# Altium schematic symbol library MCU_ST_STM32F4.SchLib: 300 symbols (part 1 of 10) (continued)
## STM32F401VDHx (continued)
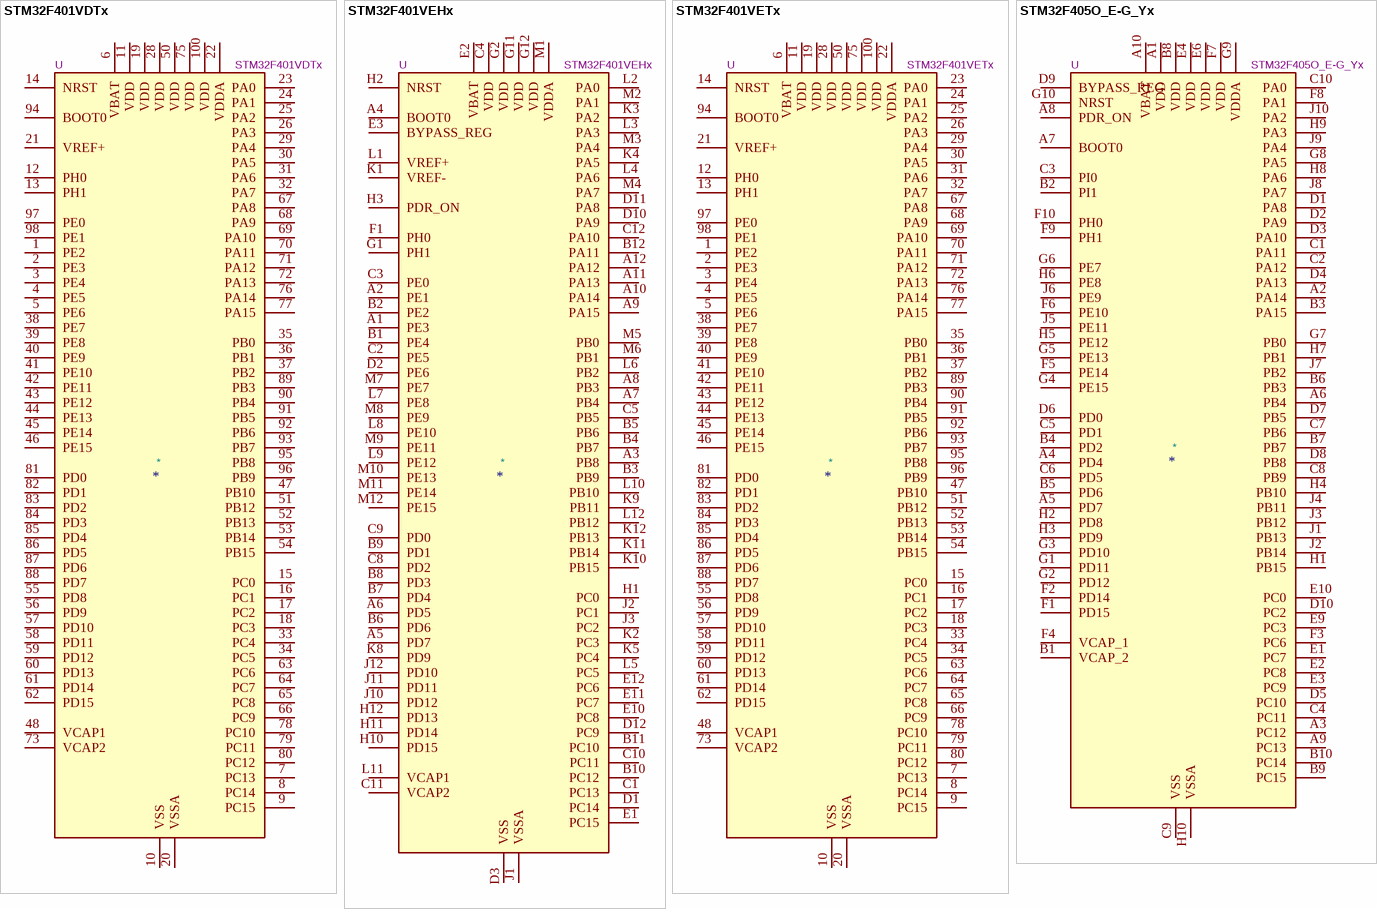
[diagram p4: symbols STM32F401VDTx to STM32F405O_E-G_Yx]

## STM32F401VDTx
designator *  value STM32F401VDTx  Reference: U
ki_keywords: Arm Cortex-M4 STM32F4 STM32F401; ki_description: STMicroelectronics Arm Cortex-M4 MCU, 384KB flash, 96KB RAM, 84 MHz, 1.7-3.6V, 81 GPIO, LQFP100; ki_fp_filters: LQFP*14x14mm*P0.5mm*; Footprint: Package_QFP:LQFP-100_14x14mm_P0.5mm; Datasheet: https://www.st.com/resource/en/datasheet/stm32f401vd.pdf
pins: 1 PE2, 2 PE3, 3 PE4, 4 PE5, 5 PE6, 6 VBAT, 7 PC13, 8 PC14, 9 PC15, 10 VSS, 11 VDD, 12 PH0, 13 PH1, 14 NRST, 15 PC0, 16 PC1, 17 PC2, 18 PC3, 19 VDD, 20 VSSA, 21 VREF+, 22 VDDA, 23 PA0, 24 PA1, 25 PA2, 26 PA3, 27 VSS hidden, 28 VDD, 29 PA4, 30 PA5, 31 PA6, 32 PA7, 33 PC4, 34 PC5, 35 PB0, 36 PB1, 37 PB2, 38 PE7, 39 PE8, 40 PE9, 41 PE10, 42 PE11, 43 PE12, 44 PE13, 45 PE14, 46 PE15, 47 PB10, 48 VCAP1, 49 VSS hidden, 50 VDD, 51 PB12, 52 PB13, 53 PB14, 54 PB15, 55 PD8, 56 PD9, 57 PD10, 58 PD11, 59 PD12, 60 PD13, 61 PD14, 62 PD15, 63 PC6, 64 PC7, 65 PC8, 66 PC9, 67 PA8, 68 PA9, 69 PA10, 70 PA11, 71 PA12, 72 PA13, 73 VCAP2, 74 VSS hidden, 75 VDD, 76 PA14, 77 PA15, 78 PC10, 79 PC11, 80 PC12, 81 PD0, 82 PD1, 83 PD2, 84 PD3, 85 PD4, 86 PD5, 87 PD6, 88 PD7, 89 PB3, 90 PB4, 91 PB5, 92 PB6, 93 PB7, 94 BOOT0, 95 PB8, 96 PB9, 97 PE0, 98 PE1, 99 VSS hidden, 100 VDD

## STM32F401VEHx
designator *  value STM32F401VEHx  Reference: U
ki_keywords: Arm Cortex-M4 STM32F4 STM32F401; ki_description: STMicroelectronics Arm Cortex-M4 MCU, 512KB flash, 96KB RAM, 84 MHz, 1.7-3.6V, 81 GPIO, UFBGA100; ki_fp_filters: *UFBGA*7x7mm*Layout12x12*P0.5mm*; Footprint: Package_BGA:UFBGA-100_7x7mm_Layout12x12_P0.5mm; Datasheet: https://www.st.com/resource/en/datasheet/stm32f401ve.pdf
pins: A1 PE3, A2 PE1, A3 PB8, A4 BOOT0, A5 PD7, A6 PD5, A7 PB4, A8 PB3, A9 PA15, A10 PA14, A11 PA13, A12 PA12, B1 PE4, B2 PE2, B3 PB9, B4 PB7, B5 PB6, B6 PD6, B7 PD4, B8 PD3, B9 PD1, B10 PC12, B11 PC10, B12 PA11, C1 PC13, C2 PE5, C3 PE0, C4 VDD, C5 PB5, C8 PD2, C9 PD0, C10 PC11, C11 VCAP2, C12 PA10, D1 PC14, D2 PE6, D3 VSS, D10 PA9, D11 PA8, D12 PC9, E1 PC15, E2 VBAT, E3 BYPASS_REG, E10 PC8, E11 PC7, E12 PC6, F1 PH0, F2 VSS hidden, F11 VSS hidden, F12 VSS hidden, G1 PH1, G2 VDD, G11 VDD, G12 VDD, H1 PC0, H2 NRST, H3 PDR_ON, H10 PD15, H11 PD14, H12 PD13, J1 VSSA, J2 PC1, J3 PC2, J10 PD12, J11 PD11, J12 PD10, K1 VREF-, K2 PC3, K3 PA2, K4 PA5, K5 PC4, K8 PD9, K9 PB11, K10 PB15, K11 PB14, K12 PB13, L1 VREF+, L2 PA0, L3 PA3, L4 PA6, L5 PC5, L6 PB2, L7 PE8, L8 PE10, L9 PE12, L10 PB10, L11 VCAP1, L12 PB12, M1 VDDA, M2 PA1, M3 PA4, M4 PA7, M5 PB0, M6 PB1, M7 PE7, M8 PE9, M9 PE11, M10 PE13, M11 PE14, M12 PE15

## STM32F401VETx
designator *  value STM32F401VETx  Reference: U
ki_keywords: Arm Cortex-M4 STM32F4 STM32F401; ki_description: STMicroelectronics Arm Cortex-M4 MCU, 512KB flash, 96KB RAM, 84 MHz, 1.7-3.6V, 81 GPIO, LQFP100; ki_fp_filters: LQFP*14x14mm*P0.5mm*; Footprint: Package_QFP:LQFP-100_14x14mm_P0.5mm; Datasheet: https://www.st.com/resource/en/datasheet/stm32f401ve.pdf
pins: 1 PE2, 2 PE3, 3 PE4, 4 PE5, 5 PE6, 6 VBAT, 7 PC13, 8 PC14, 9 PC15, 10 VSS, 11 VDD, 12 PH0, 13 PH1, 14 NRST, 15 PC0, 16 PC1, 17 PC2, 18 PC3, 19 VDD, 20 VSSA, 21 VREF+, 22 VDDA, 23 PA0, 24 PA1, 25 PA2, 26 PA3, 27 VSS hidden, 28 VDD, 29 PA4, 30 PA5, 31 PA6, 32 PA7, 33 PC4, 34 PC5, 35 PB0, 36 PB1, 37 PB2, 38 PE7, 39 PE8, 40 PE9, 41 PE10, 42 PE11, 43 PE12, 44 PE13, 45 PE14, 46 PE15, 47 PB10, 48 VCAP1, 49 VSS hidden, 50 VDD, 51 PB12, 52 PB13, 53 PB14, 54 PB15, 55 PD8, 56 PD9, 57 PD10, 58 PD11, 59 PD12, 60 PD13, 61 PD14, 62 PD15, 63 PC6, 64 PC7, 65 PC8, 66 PC9, 67 PA8, 68 PA9, 69 PA10, 70 PA11, 71 PA12, 72 PA13, 73 VCAP2, 74 VSS hidden, 75 VDD, 76 PA14, 77 PA15, 78 PC10, 79 PC11, 80 PC12, 81 PD0, 82 PD1, 83 PD2, 84 PD3, 85 PD4, 86 PD5, 87 PD6, 88 PD7, 89 PB3, 90 PB4, 91 PB5, 92 PB6, 93 PB7, 94 BOOT0, 95 PB8, 96 PB9, 97 PE0, 98 PE1, 99 VSS hidden, 100 VDD

## STM32F405O_E-G_Yx
designator *  value STM32F405O_E-G_Yx  Reference: U
ki_keywords: Arm Cortex-M4 STM32F4 STM32F405/415; ki_description: STMicroelectronics Arm Cortex-M4 MCU, 512-1024KB flash, 192KB RAM, 168 MHz, 1.8-3.6V, 72 GPIO, WLCSP90; ki_fp_filters: ST*WLCSP*Die413*; Footprint: Package_CSP:ST_WLCSP-90_Die413; Datasheet: https://www.st.com/resource/en/datasheet/stm32f405oe.pdf
pins: A1 VDD, A2 PA14, A3 PC12, A4 PD4, A5 PD7, A6 PB4, A7 BOOT0, A8 PDR_ON, A9 PC13, A10 VBAT, B1 VCAP_2, B2 PI1, B3 PA15, B4 PD2, B5 PD6, B6 PB3, B7 PB7, B8 VDD, B9 PC15, B10 PC14, C1 PA11, C2 PA12, C3 PI0, C4 PC11, C5 PD1, C6 PD5, C7 PB6, C8 PB9, C9 VSS, C10 PA0, D1 PA8, D2 PA9, D3 PA10, D4 PA13, D5 PC10, D6 PD0, D7 PB5, D8 PB8, D9 BYPASS_REG, D10 PC2, E1 PC7, E2 PC8, E3 PC9, E4 VDD, E5 VSS hidden, E6 VDD, E7 VSS hidden, E8 VSS hidden, E9 PC3, E10 PC0, F1 PD15, F2 PD14, F3 PC6, F4 VCAP_1, F5 PE14, F6 PE10, F7 VDD, F8 PA1, F9 PH1, F10 PH0, G1 PD11, G2 PD12, G3 PD10, G4 PE15, G5 PE13, G6 PE7, G7 PB0, G8 PA5, G9 VDDA, G10 NRST, H1 PB15, H2 PD8, H3 PD9, H4 PB10, H5 PE12, H6 PE8, H7 PB1, H8 PA6, H9 PA3, H10 VSSA, J1 PB13, J2 PB14, J3 PB12, J4 PB11, J5 PE11, J6 PE9, J7 PB2, J8 PA7, J9 PA4, J10 PA2

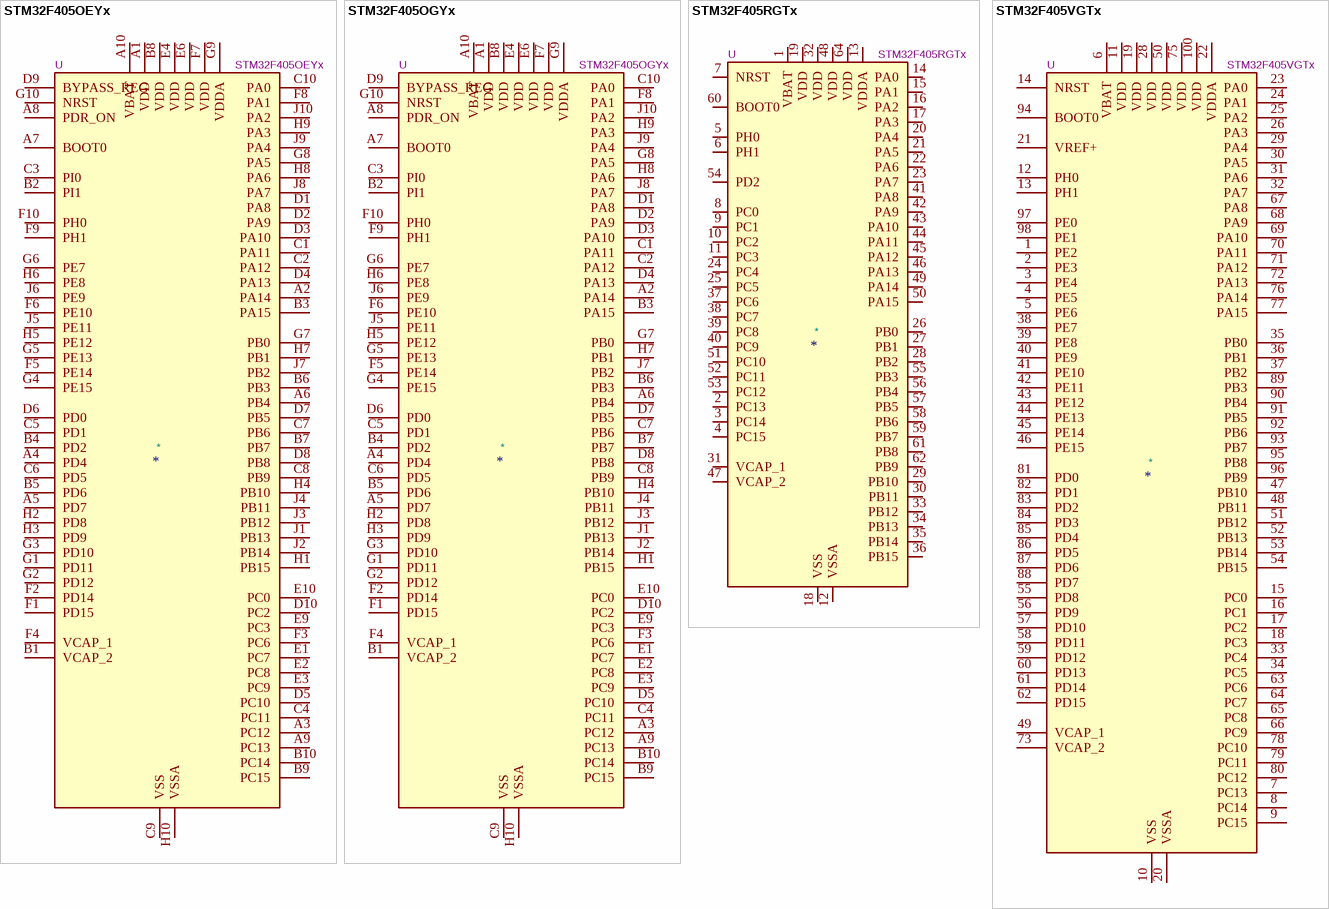
[diagram p5: symbols STM32F405OEYx to STM32F405VGTx]

## STM32F405OEYx
designator *  value STM32F405OEYx  Reference: U
ki_keywords: Arm Cortex-M4 STM32F4 STM32F405/415; ki_description: STMicroelectronics Arm Cortex-M4 MCU, 512KB flash, 192KB RAM, 168 MHz, 1.8-3.6V, 72 GPIO, WLCSP90; ki_fp_filters: ST*WLCSP*Die413*; Footprint: Package_CSP:ST_WLCSP-90_Die413; Datasheet: https://www.st.com/resource/en/datasheet/stm32f405oe.pdf
pins: A1 VDD, A2 PA14, A3 PC12, A4 PD4, A5 PD7, A6 PB4, A7 BOOT0, A8 PDR_ON, A9 PC13, A10 VBAT, B1 VCAP_2, B2 PI1, B3 PA15, B4 PD2, B5 PD6, B6 PB3, B7 PB7, B8 VDD, B9 PC15, B10 PC14, C1 PA11, C2 PA12, C3 PI0, C4 PC11, C5 PD1, C6 PD5, C7 PB6, C8 PB9, C9 VSS, C10 PA0, D1 PA8, D2 PA9, D3 PA10, D4 PA13, D5 PC10, D6 PD0, D7 PB5, D8 PB8, D9 BYPASS_REG, D10 PC2, E1 PC7, E2 PC8, E3 PC9, E4 VDD, E5 VSS hidden, E6 VDD, E7 VSS hidden, E8 VSS hidden, E9 PC3, E10 PC0, F1 PD15, F2 PD14, F3 PC6, F4 VCAP_1, F5 PE14, F6 PE10, F7 VDD, F8 PA1, F9 PH1, F10 PH0, G1 PD11, G2 PD12, G3 PD10, G4 PE15, G5 PE13, G6 PE7, G7 PB0, G8 PA5, G9 VDDA, G10 NRST, H1 PB15, H2 PD8, H3 PD9, H4 PB10, H5 PE12, H6 PE8, H7 PB1, H8 PA6, H9 PA3, H10 VSSA, J1 PB13, J2 PB14, J3 PB12, J4 PB11, J5 PE11, J6 PE9, J7 PB2, J8 PA7, J9 PA4, J10 PA2

## STM32F405OGYx
designator *  value STM32F405OGYx  Reference: U
ki_keywords: Arm Cortex-M4 STM32F4 STM32F405/415; ki_description: STMicroelectronics Arm Cortex-M4 MCU, 1024KB flash, 192KB RAM, 168 MHz, 1.8-3.6V, 72 GPIO, WLCSP90; ki_fp_filters: ST*WLCSP*Die413*; Footprint: Package_CSP:ST_WLCSP-90_Die413; Datasheet: https://www.st.com/resource/en/datasheet/stm32f405og.pdf
pins: A1 VDD, A2 PA14, A3 PC12, A4 PD4, A5 PD7, A6 PB4, A7 BOOT0, A8 PDR_ON, A9 PC13, A10 VBAT, B1 VCAP_2, B2 PI1, B3 PA15, B4 PD2, B5 PD6, B6 PB3, B7 PB7, B8 VDD, B9 PC15, B10 PC14, C1 PA11, C2 PA12, C3 PI0, C4 PC11, C5 PD1, C6 PD5, C7 PB6, C8 PB9, C9 VSS, C10 PA0, D1 PA8, D2 PA9, D3 PA10, D4 PA13, D5 PC10, D6 PD0, D7 PB5, D8 PB8, D9 BYPASS_REG, D10 PC2, E1 PC7, E2 PC8, E3 PC9, E4 VDD, E5 VSS hidden, E6 VDD, E7 VSS hidden, E8 VSS hidden, E9 PC3, E10 PC0, F1 PD15, F2 PD14, F3 PC6, F4 VCAP_1, F5 PE14, F6 PE10, F7 VDD, F8 PA1, F9 PH1, F10 PH0, G1 PD11, G2 PD12, G3 PD10, G4 PE15, G5 PE13, G6 PE7, G7 PB0, G8 PA5, G9 VDDA, G10 NRST, H1 PB15, H2 PD8, H3 PD9, H4 PB10, H5 PE12, H6 PE8, H7 PB1, H8 PA6, H9 PA3, H10 VSSA, J1 PB13, J2 PB14, J3 PB12, J4 PB11, J5 PE11, J6 PE9, J7 PB2, J8 PA7, J9 PA4, J10 PA2

## STM32F405RGTx
designator *  value STM32F405RGTx  Reference: U
ki_keywords: Arm Cortex-M4 STM32F4 STM32F405/415; ki_description: STMicroelectronics Arm Cortex-M4 MCU, 1024KB flash, 192KB RAM, 168 MHz, 1.8-3.6V, 51 GPIO, LQFP64; ki_fp_filters: LQFP*10x10mm*P0.5mm*; Footprint: Package_QFP:LQFP-64_10x10mm_P0.5mm; Datasheet: https://www.st.com/resource/en/datasheet/stm32f405rg.pdf
pins: 1 VBAT, 2 PC13, 3 PC14, 4 PC15, 5 PH0, 6 PH1, 7 NRST, 8 PC0, 9 PC1, 10 PC2, 11 PC3, 12 VSSA, 13 VDDA, 14 PA0, 15 PA1, 16 PA2, 17 PA3, 18 VSS, 19 VDD, 20 PA4, 21 PA5, 22 PA6, 23 PA7, 24 PC4, 25 PC5, 26 PB0, 27 PB1, 28 PB2, 29 PB10, 30 PB11, 31 VCAP_1, 32 VDD, 33 PB12, 34 PB13, 35 PB14, 36 PB15, 37 PC6, 38 PC7, 39 PC8, 40 PC9, 41 PA8, 42 PA9, 43 PA10, 44 PA11, 45 PA12, 46 PA13, 47 VCAP_2, 48 VDD, 49 PA14, 50 PA15, 51 PC10, 52 PC11, 53 PC12, 54 PD2, 55 PB3, 56 PB4, 57 PB5, 58 PB6, 59 PB7, 60 BOOT0, 61 PB8, 62 PB9, 63 VSS hidden, 64 VDD

## STM32F405VGTx
designator *  value STM32F405VGTx  Reference: U
ki_keywords: Arm Cortex-M4 STM32F4 STM32F405/415; ki_description: STMicroelectronics Arm Cortex-M4 MCU, 1024KB flash, 192KB RAM, 168 MHz, 1.8-3.6V, 82 GPIO, LQFP100; ki_fp_filters: LQFP*14x14mm*P0.5mm*; Footprint: Package_QFP:LQFP-100_14x14mm_P0.5mm; Datasheet: https://www.st.com/resource/en/datasheet/stm32f405vg.pdf
pins: 1 PE2, 2 PE3, 3 PE4, 4 PE5, 5 PE6, 6 VBAT, 7 PC13, 8 PC14, 9 PC15, 10 VSS, 11 VDD, 12 PH0, 13 PH1, 14 NRST, 15 PC0, 16 PC1, 17 PC2, 18 PC3, 19 VDD, 20 VSSA, 21 VREF+, 22 VDDA, 23 PA0, 24 PA1, 25 PA2, 26 PA3, 27 VSS hidden, 28 VDD, 29 PA4, 30 PA5, 31 PA6, 32 PA7, 33 PC4, 34 PC5, 35 PB0, 36 PB1, 37 PB2, 38 PE7, 39 PE8, 40 PE9, 41 PE10, 42 PE11, 43 PE12, 44 PE13, 45 PE14, 46 PE15, 47 PB10, 48 PB11, 49 VCAP_1, 50 VDD, 51 PB12, 52 PB13, 53 PB14, 54 PB15, 55 PD8, 56 PD9, 57 PD10, 58 PD11, 59 PD12, 60 PD13, 61 PD14, 62 PD15, 63 PC6, 64 PC7, 65 PC8, 66 PC9, 67 PA8, 68 PA9, 69 PA10, 70 PA11, 71 PA12, 72 PA13, 73 VCAP_2, 74 VSS hidden, 75 VDD, 76 PA14, 77 PA15, 78 PC10, 79 PC11, 80 PC12, 81 PD0, 82 PD1, 83 PD2, 84 PD3, 85 PD4, 86 PD5, 87 PD6, 88 PD7, 89 PB3, 90 PB4, 91 PB5, 92 PB6, 93 PB7, 94 BOOT0, 95 PB8, 96 PB9, 97 PE0, 98 PE1, 99 VSS hidden, 100 VDD

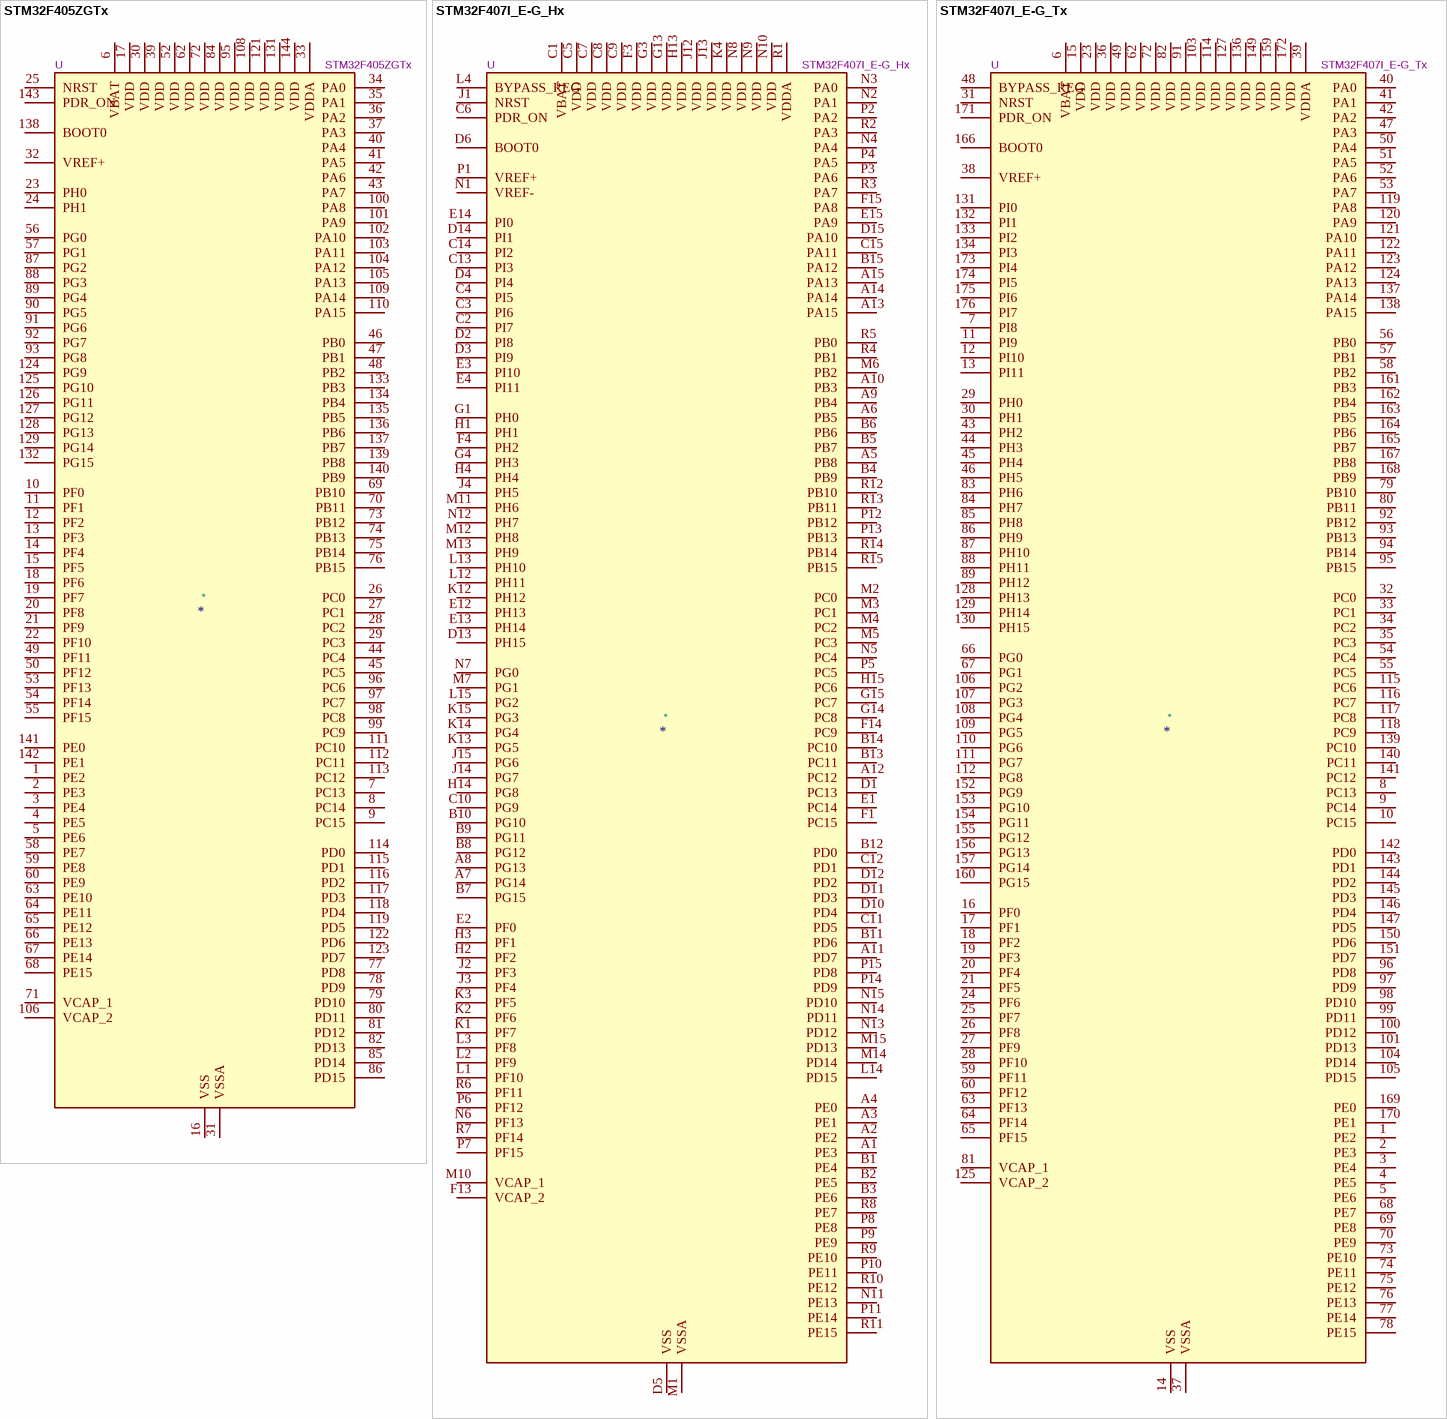
[diagram p6: symbols STM32F405ZGTx to STM32F407I_E-G_Tx]

## STM32F405ZGTx
designator *  value STM32F405ZGTx  Reference: U
ki_keywords: Arm Cortex-M4 STM32F4 STM32F405/415; ki_description: STMicroelectronics Arm Cortex-M4 MCU, 1024KB flash, 192KB RAM, 168 MHz, 1.8-3.6V, 114 GPIO, LQFP144; ki_fp_filters: LQFP*20x20mm*P0.5mm*; Footprint: Package_QFP:LQFP-144_20x20mm_P0.5mm; Datasheet: https://www.st.com/resource/en/datasheet/stm32f405zg.pdf
pins: 1 PE2, 2 PE3, 3 PE4, 4 PE5, 5 PE6, 6 VBAT, 7 PC13, 8 PC14, 9 PC15, 10 PF0, 11 PF1, 12 PF2, 13 PF3, 14 PF4, 15 PF5, 16 VSS, 17 VDD, 18 PF6, 19 PF7, 20 PF8, 21 PF9, 22 PF10, 23 PH0, 24 PH1, 25 NRST, 26 PC0, 27 PC1, 28 PC2, 29 PC3, 30 VDD, 31 VSSA, 32 VREF+, 33 VDDA, 34 PA0, 35 PA1, 36 PA2, 37 PA3, 38 VSS hidden, 39 VDD, 40 PA4, 41 PA5, 42 PA6, 43 PA7, 44 PC4, 45 PC5, 46 PB0, 47 PB1, 48 PB2, 49 PF11, 50 PF12, 51 VSS hidden, 52 VDD, 53 PF13, 54 PF14, 55 PF15, 56 PG0, 57 PG1, 58 PE7, 59 PE8, 60 PE9, 61 VSS hidden, 62 VDD, 63 PE10, 64 PE11, 65 PE12, 66 PE13, 67 PE14, 68 PE15, 69 PB10, 70 PB11, 71 VCAP_1, 72 VDD, 73 PB12, 74 PB13, 75 PB14, 76 PB15, 77 PD8, 78 PD9, 79 PD10, 80 PD11, 81 PD12, 82 PD13, 83 VSS hidden, 84 VDD, 85 PD14, 86 PD15, 87 PG2, 88 PG3, 89 PG4, 90 PG5, 91 PG6, 92 PG7, 93 PG8, 94 VSS hidden, 95 VDD, 96 PC6, 97 PC7, 98 PC8, 99 PC9, 100 PA8, 101 PA9, 102 PA10, 103 PA11, 104 PA12, 105 PA13, 106 VCAP_2, 107 VSS hidden, 108 VDD, 109 PA14, 110 PA15, 111 PC10, 112 PC11, 113 PC12, 114 PD0, 115 PD1, 116 PD2, 117 PD3, 118 PD4, 119 PD5, 120 VSS hidden, 121 VDD, 122 PD6, 123 PD7, 124 PG9, 125 PG10, 126 PG11, 127 PG12, 128 PG13, 129 PG14, 130 VSS hidden, 131 VDD, 132 PG15, 133 PB3, 134 PB4, 135 PB5, 136 PB6, 137 PB7, 138 BOOT0, 139 PB8, 140 PB9, 141 PE0, 142 PE1, 143 PDR_ON, 144 VDD

## STM32F407I_E-G_Hx
designator *  value STM32F407I_E-G_Hx  Reference: U
ki_keywords: Arm Cortex-M4 STM32F4 STM32F407/417; ki_description: STMicroelectronics Arm Cortex-M4 MCU, 512-1024KB flash, 192KB RAM, 168 MHz, 1.8-3.6V, 140 GPIO, UFBGA176; ki_fp_filters: *UFBGA*10x10mm*Layout15x15*P0.65mm*; Footprint: Package_BGA:UFBGA-201_10x10mm_Layout15x15_P0.65mm; Datasheet: https://www.st.com/resource/en/datasheet/stm32f407ie.pdf
pins: A1 PE3, A2 PE2, A3 PE1, A4 PE0, A5 PB8, A6 PB5, A7 PG14, A8 PG13, A9 PB4, A10 PB3, A11 PD7, A12 PC12, A13 PA15, A14 PA14, A15 PA13, B1 PE4, B2 PE5, B3 PE6, B4 PB9, B5 PB7, B6 PB6, B7 PG15, B8 PG12, B9 PG11, B10 PG10, B11 PD6, B12 PD0, B13 PC11, B14 PC10, B15 PA12, C1 VBAT, C2 PI7, C3 PI6, C4 PI5, C5 VDD, C6 PDR_ON, C7 VDD, C8 VDD, C9 VDD, C10 PG9, C11 PD5, C12 PD1, C13 PI3, C14 PI2, C15 PA11, D1 PC13, D2 PI8, D3 PI9, D4 PI4, D5 VSS, D6 BOOT0, D7 VSS hidden, D8 VSS hidden, D9 VSS hidden, D10 PD4, D11 PD3, D12 PD2, D13 PH15, D14 PI1, D15 PA10, E1 PC14, E2 PF0, E3 PI10, E4 PI11, E12 PH13, E13 PH14, E14 PI0, E15 PA9, F1 PC15, F2 VSS hidden, F3 VDD, F4 PH2, F6 VSS hidden, F7 VSS hidden, F8 VSS hidden, F9 VSS hidden, F10 VSS hidden, F12 VSS hidden, F13 VCAP_2, F14 PC9, F15 PA8, G1 PH0, G2 VSS hidden, G3 VDD, G4 PH3, G6 VSS hidden, G7 VSS hidden, G8 VSS hidden, G9 VSS hidden, G10 VSS hidden, G12 VSS hidden, G13 VDD, G14 PC8, G15 PC7, H1 PH1, H2 PF2, H3 PF1, H4 PH4, H6 VSS hidden, H7 VSS hidden, H8 VSS hidden, H9 VSS hidden, H10 VSS hidden, H12 VSS hidden, H13 VDD, H14 PG8, H15 PC6, J1 NRST, J2 PF3, J3 PF4, J4 PH5, J6 VSS hidden, J7 VSS hidden, J8 VSS hidden, J9 VSS hidden, J10 VSS hidden, J12 VDD, J13 VDD, J14 PG7, J15 PG6, K1 PF7, K2 PF6, K3 PF5, K4 VDD, K6 VSS hidden, K7 VSS hidden, K8 VSS hidden, K9 VSS hidden, K10 VSS hidden, K12 PH12, K13 PG5, K14 PG4, K15 PG3, L1 PF10, L2 PF9, L3 PF8, L4 BYPASS_REG, L12 PH11, L13 PH10, L14 PD15, L15 PG2, M1 VSSA, M2 PC0, M3 PC1, M4 PC2, M5 PC3, M6 PB2, M7 PG1, M8 VSS hidden, M9 VSS hidden, M10 VCAP_1, M11 PH6, M12 PH8, M13 PH9, M14 PD14, M15 PD13, N1 VREF-, N2 PA1, N3 PA0, N4 PA4, N5 PC4, N6 PF13, N7 PG0, N8 VDD, N9 VDD, N10 VDD, N11 PE13, N12 PH7, N13 PD12, N14 PD11, N15 PD10, P1 VREF+, P2 PA2, P3 PA6, P4 PA5, P5 PC5, P6 PF12, P7 PF15, P8 PE8, P9 PE9, P10 PE11, P11 PE14, P12 PB12, P13 PB13, P14 PD9, P15 PD8, R1 VDDA, R2 PA3, R3 PA7, R4 PB1, R5 PB0, R6 PF11, R7 PF14, R8 PE7, R9 PE10, R10 PE12, R11 PE15, R12 PB10, R13 PB11, R14 PB14, R15 PB15